# Altium footprint library goldpin_female_pcb.PcbLib: 81 footprints (part 4 of 6)
Each footprint in its own frame and in the unit in brackets; x right, y up, seen from the top. Pads: shape width x height; smd on the part's side, far side on the other; paste and mask are expansions set on the pad; w line width, h text height; cw(c..) or ccw(c..) is an arc to the next point about the centre after c.
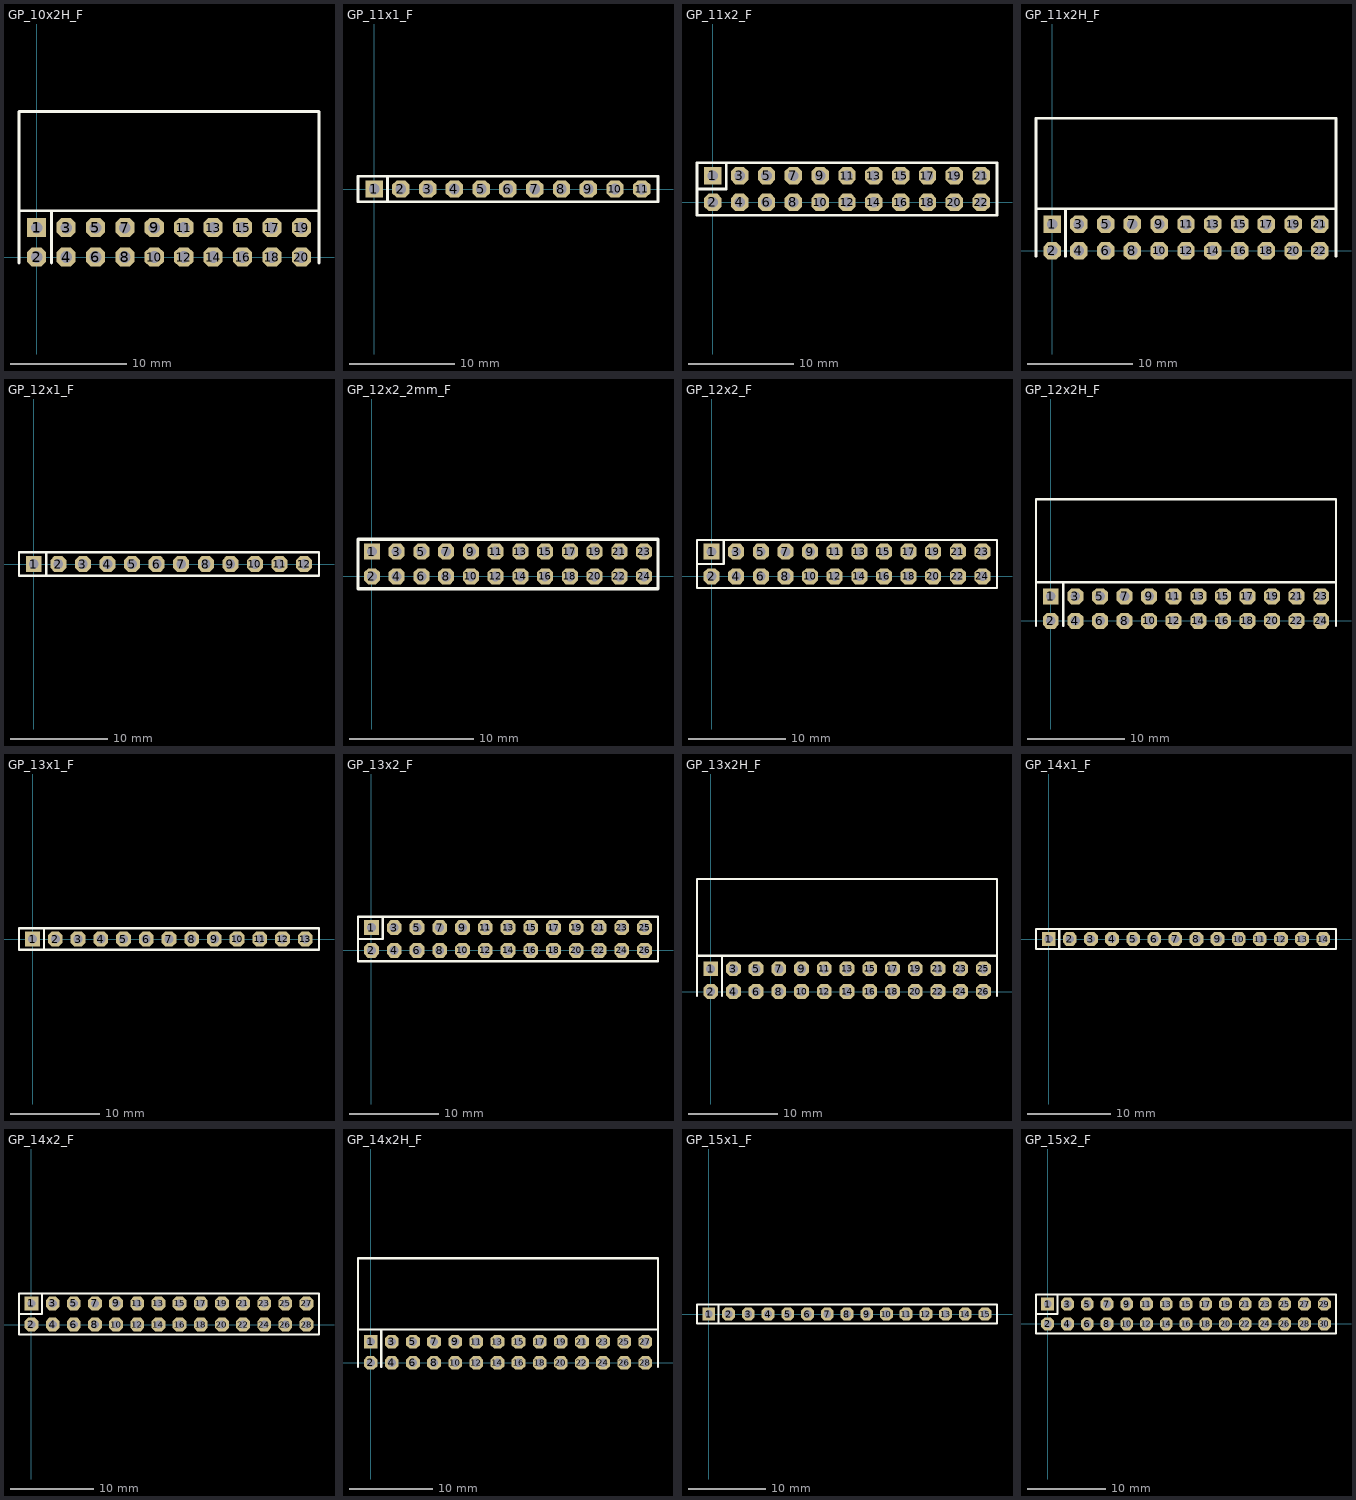
[diagram p3: the footprints below, top view; thin cyan lines are the x and y axes]

## GP_10x2H_F [mil]
pads (20):
  rect 65x65 hole 39.37: 1(0,100)
  oct 65x65 hole 39.37: 2(0,0) 3(100,100) 4(100,0) 5(200,100) 6(200,0) 7(300,100) 8(300,0) 9(400,100) 10(400,0) 11(500,100) 12(500,0) 13(600,100) 14(600,0) 15(700,100) 16(700,0) 17(800,100) 18(800,0) 19(900,100) 20(900,0)
Top Overlay:
  lines w10: -60,-20 -60,495 960,495 960,-20 ; -60,157.24 960,157.24 ; 50,-20 50,157.24
3D body "Samtec-SSW-110-22-G-D-RA.step": height 197.89, standoff -97.11, extent -59.06,-11.81 960.94,491.19

## GP_11x1_F [mil]
pads (11):
  rect 65x65 hole 39.37: 1(0,0)
  oct 65x65 hole 39.37: 2(100,0) 3(200,0) 4(300,0) 5(400,0) 6(500,0) 7(600,0) 8(700,0) 9(800,0) 10(900,0) 11(1000,0)
Top Overlay:
  lines w10: 50,-47.24 50,45 ; -60,-47.24 -60,47.24 1060.63,47.24 1060.63,-47.24 -60,-47.24
3D body "Samtec-SSW-111-01-G-S.step": height 335, standoff -104, extent -60,-47.5 1060,47.5

## GP_11x2_F [mil]
pads (22):
  rect 65x65 hole 39.37: 1(0,100)
  oct 65x65 hole 39.37: 2(0,0) 3(100,100) 4(100,0) 5(200,100) 6(200,0) 7(300,100) 8(300,0) 9(400,100) 10(400,0) 11(500,100) 12(500,0) 13(600,100) 14(600,0) 15(700,100) 16(700,0) 17(800,100) 18(800,0) 19(900,100) 20(900,0) 21(1000,100) 22(1000,0)
Top Overlay:
  lines w10: -59.06,50 50,50 50,147.51 ; -59.06,-47.49 1059.06,-47.49 1059.06,147.49 -59.06,147.51 -59.06,-47.49
3D body "Samtec-SSW-111-01-G-D.step": height 335, standoff -104, extent -60,-47.49 1060,147.51

## GP_11x2H_F [mil]
pads (22):
  rect 65x65 hole 39.37: 1(0,100)
  oct 65x65 hole 39.37: 2(0,0) 3(100,100) 4(100,0) 5(200,100) 6(200,0) 7(300,100) 8(300,0) 9(400,100) 10(400,0) 11(500,100) 12(500,0) 13(600,100) 14(600,0) 15(700,100) 16(700,0) 17(800,100) 18(800,0) 19(900,100) 20(900,0) 21(1000,100) 22(1000,0)
Top Overlay:
  lines w10: -60,-20 -60,495 1060,495 1060,-20 ; -60,157.24 1060,157.24 ; 50,-20 50,157.24
3D body "Samtec-SSW-111-22-G-D-RA.step": height 197.89, standoff -97.11, extent -59.06,-11.81 1060.94,491.19

## GP_12x1_F [mil]
pads (12):
  rect 65x65 hole 39.37: 1(0,0)
  oct 65x65 hole 39.37: 2(100,0) 3(200,0) 4(300,0) 5(400,0) 6(500,0) 7(600,0) 8(700,0) 9(800,0) 10(900,0) 11(1000,0) 12(1100,0)
Top Overlay:
  lines w10: 50,-47.24 50,45 ; -60,-47.24 1160.63,-47.24 1160.63,47.24 -60,47.24 -60,-47.24
3D body "Samtec-SSW-112-01-G-S.step": height 335, standoff -104, extent -60,-47.5 1160,47.5

## GP_12x2_2mm_F [mm]
height 4.45
pads (24):
  rect 1.3x1.3 hole 0.8: 1(0,2)
  oct 1.3x1.3 hole 0.8: 2(0,0) 3(2,2) 4(2,0) 5(4,2) 6(4,0) 7(6,2) 8(6,0) 9(8,2) 10(8,0) 11(10,2) 12(10,0) 13(12,2) 14(12,0) 15(14,2) 16(14,0) 17(16,2) 18(16,0) 19(18,2) 20(18,0) 21(20,2) 22(20,0) 23(22,2) 24(22,0)
Top Overlay:
  lines w0.254: -1.125,-1 23.125,-1 23.125,2.999 -1.125,2.999 -1.125,-1
3D body "Samtec-MMS-112-1-L-DV.STEP": height 4.44, standoff -2.92, extent -1.125,-0.999 23.109,2.999

## GP_12x2_F [mil]
pads (24):
  rect 65x65 hole 39.37: 1(0,100)
  oct 65x65 hole 39.37: 2(0,0) 3(100,100) 4(100,0) 5(200,100) 6(200,0) 7(300,100) 8(300,0) 9(400,100) 10(400,0) 11(500,100) 12(500,0) 13(600,100) 14(600,0) 15(700,100) 16(700,0) 17(800,100) 18(800,0) 19(900,100) 20(900,0) 21(1000,100) 22(1000,0) 23(1100,100) 24(1100,0)
Top Overlay:
  lines w10: -59.06,50 50,50 50,147.51 ; -59.06,-47.49 -59.06,147.51 1159.06,147.51 1159.06,-47.51 -59.06,-47.49
3D body "Samtec-SSW-112-01-G-D.step": height 335, standoff -104, extent -60,-47.49 1160,147.51

## GP_12x2H_F [mil]
pads (24):
  rect 65x65 hole 39.37: 1(0,100)
  oct 65x65 hole 39.37: 2(0,0) 3(100,100) 4(100,0) 5(200,100) 6(200,0) 7(300,100) 8(300,0) 9(400,100) 10(400,0) 11(500,100) 12(500,0) 13(600,100) 14(600,0) 15(700,100) 16(700,0) 17(800,100) 18(800,0) 19(900,100) 20(900,0) 21(1000,100) 22(1000,0) 23(1100,100) 24(1100,0)
Top Overlay:
  lines w10: -60,-20 -60,495 1160,495 1160,-20 ; -60,157.24 1160,157.24 ; 50,-20 50,157.24
3D body "Samtec-SSW-112-22-G-D-RA.step": height 197.89, standoff -97.11, extent -59.06,-11.81 1160.94,491.19

## GP_13x1_F [mil]
pads (13):
  rect 65x65 hole 39.37: 1(0,0)
  oct 65x65 hole 39.37: 2(100,0) 3(200,0) 4(300,0) 5(400,0) 6(500,0) 7(600,0) 8(700,0) 9(800,0) 10(900,0) 11(1000,0) 12(1100,0) 13(1200,0)
Top Overlay:
  lines w10: 50,-47.24 50,45 ; -60,-47.24 1260.63,-47.24 1260.63,47.24 -60,47.24 -60,-47.24
3D body "Samtec-SSW-113-01-G-S.step": height 335, standoff -104, extent -60,-47.5 1260,47.5

## GP_13x2_F [mil]
pads (26):
  rect 65x65 hole 39.37: 1(0,100)
  oct 65x65 hole 39.37: 2(0,0) 3(100,100) 4(100,0) 5(200,100) 6(200,0) 7(300,100) 8(300,0) 9(400,100) 10(400,0) 11(500,100) 12(500,0) 13(600,100) 14(600,0) 15(700,100) 16(700,0) 17(800,100) 18(800,0) 19(900,100) 20(900,0) 21(1000,100) 22(1000,0) 23(1100,100) 24(1100,0) 25(1200,100) 26(1200,0)
Top Overlay:
  lines w10: -59.06,50 50,50 50,147.51 ; -59.06,-47.49 1259.06,-47.49 1259.06,147.49 -59.06,147.51 -59.06,-47.49
3D body "Samtec-SSW-113-01-G-D.step": height 335, standoff -104, extent -60,-47.49 1260,147.51

## GP_13x2H_F [mil]
pads (26):
  rect 65x65 hole 39.37: 1(0,100)
  oct 65x65 hole 39.37: 2(0,0) 3(100,100) 4(100,0) 5(200,100) 6(200,0) 7(300,100) 8(300,0) 9(400,100) 10(400,0) 11(500,100) 12(500,0) 13(600,100) 14(600,0) 15(700,100) 16(700,0) 17(800,100) 18(800,0) 19(900,100) 20(900,0) 21(1000,100) 22(1000,0) 23(1100,100) 24(1100,0) 25(1200,100) 26(1200,0)
Top Overlay:
  lines w10: -60,-20 -60,495 1260,495 1260,-20 ; -60,157.24 1259.84,157.24 ; 50,-20 50,157.24
3D body "Samtec-SSW-113-22-G-D-RA.step": height 197.89, standoff -97.11, extent -59.06,-11.81 1260.94,491.19

## GP_14x1_F [mil]
pads (14):
  rect 65x65 hole 39.37: 1(0,0)
  oct 65x65 hole 39.37: 2(100,0) 3(200,0) 4(300,0) 5(400,0) 6(500,0) 7(600,0) 8(700,0) 9(800,0) 10(900,0) 11(1000,0) 12(1100,0) 13(1200,0) 14(1300,0)
Top Overlay:
  lines w10: 50,-47.24 50,45 ; -60,-47.24 -60,47.24 1360.63,47.24 1360.63,-47.24 -60,-47.24
3D body "Samtec-SSW-114-01-G-S.step": height 335, standoff -104, extent -60,-47.5 1360,47.5

## GP_14x2_F [mil]
pads (28):
  rect 65x65 hole 39.37: 1(0,100)
  oct 65x65 hole 39.37: 2(0,0) 3(100,100) 4(100,0) 5(200,100) 6(200,0) 7(300,100) 8(300,0) 9(400,100) 10(400,0) 11(500,100) 12(500,0) 13(600,100) 14(600,0) 15(700,100) 16(700,0) 17(800,100) 18(800,0) 19(900,100) 20(900,0) 21(1000,100) 22(1000,0) 23(1100,100) 24(1100,0) 25(1200,100) 26(1200,0) 27(1300,100) 28(1300,0)
Top Overlay:
  lines w10: -59.06,50 50,50 50,147.51 ; -59.06,-47.49 -59.06,147.51 1359.06,147.51 1359.06,-47.51 -59.06,-47.49
3D body "Samtec-SSW-114-01-G-D.step": height 335, standoff -104, extent -60,-47.49 1360,147.51

## GP_14x2H_F [mil]
pads (28):
  rect 65x65 hole 39.37: 1(0,100)
  oct 65x65 hole 39.37: 2(0,0) 3(100,100) 4(100,0) 5(200,100) 6(200,0) 7(300,100) 8(300,0) 9(400,100) 10(400,0) 11(500,100) 12(500,0) 13(600,100) 14(600,0) 15(700,100) 16(700,0) 17(800,100) 18(800,0) 19(900,100) 20(900,0) 21(1000,100) 22(1000,0) 23(1100,100) 24(1100,0) 25(1200,100) 26(1200,0) 27(1300,100) 28(1300,0)
Top Overlay:
  lines w10: -60,-20 -60,495 1360,495 1360,-20 ; -60,157.24 1360,157.24 ; 50,-20 50,157.24
3D body "Samtec-SSW-114-22-G-D-RA.step": height 197.89, standoff -97.11, extent -59.06,-11.81 1360.94,491.19

## GP_15x1_F [mil]
pads (15):
  rect 65x65 hole 39.37: 1(0,0)
  oct 65x65 hole 39.37: 2(100,0) 3(200,0) 4(300,0) 5(400,0) 6(500,0) 7(600,0) 8(700,0) 9(800,0) 10(900,0) 11(1000,0) 12(1100,0) 13(1200,0) 14(1300,0) 15(1400,0)
Top Overlay:
  lines w10: 50,-47.24 50,45 ; -60,-47.24 -60,47.24 1460.63,47.24 1460.63,-47.24 -60,-47.24
3D body "Samtec-SSW-115-01-G-S.step": height 335, standoff -104, extent -60,-47.5 1460,47.5

## GP_15x2_F [mil]
pads (30):
  rect 65x65 hole 39.37: 1(0,100)
  oct 65x65 hole 39.37: 2(0,0) 3(100,100) 4(100,0) 5(200,100) 6(200,0) 7(300,100) 8(300,0) 9(400,100) 10(400,0) 11(500,100) 12(500,0) 13(600,100) 14(600,0) 15(700,100) 16(700,0) 17(800,100) 18(800,0) 19(900,100) 20(900,0) 21(1000,100) 22(1000,0) 23(1100,100) 24(1100,0) 25(1200,100) 26(1200,0) 27(1300,100) 28(1300,0) 29(1400,100) 30(1400,0)
Top Overlay:
  lines w10: -59.06,50 50,50 50,147.51 ; -59.06,-47.49 -59.06,147.51 1459.06,147.51 1459.06,-47.51 -59.06,-47.49
3D body "Samtec-SSW-115-01-G-D.step": height 335, standoff -104, extent -60,-47.49 1460,147.51